# Altium footprint library 7.Connectors&Battary_holders.PcbLib: 133 footprints (part 6 of 9)
Each footprint in its own frame and in the unit in brackets; x right, y up, seen from the top. Pads: shape width x height; smd on the part's side, far side on the other; paste and mask are expansions set on the pad; w line width, h text height; cw(c..) or ccw(c..) is an arc to the next point about the centre after c.
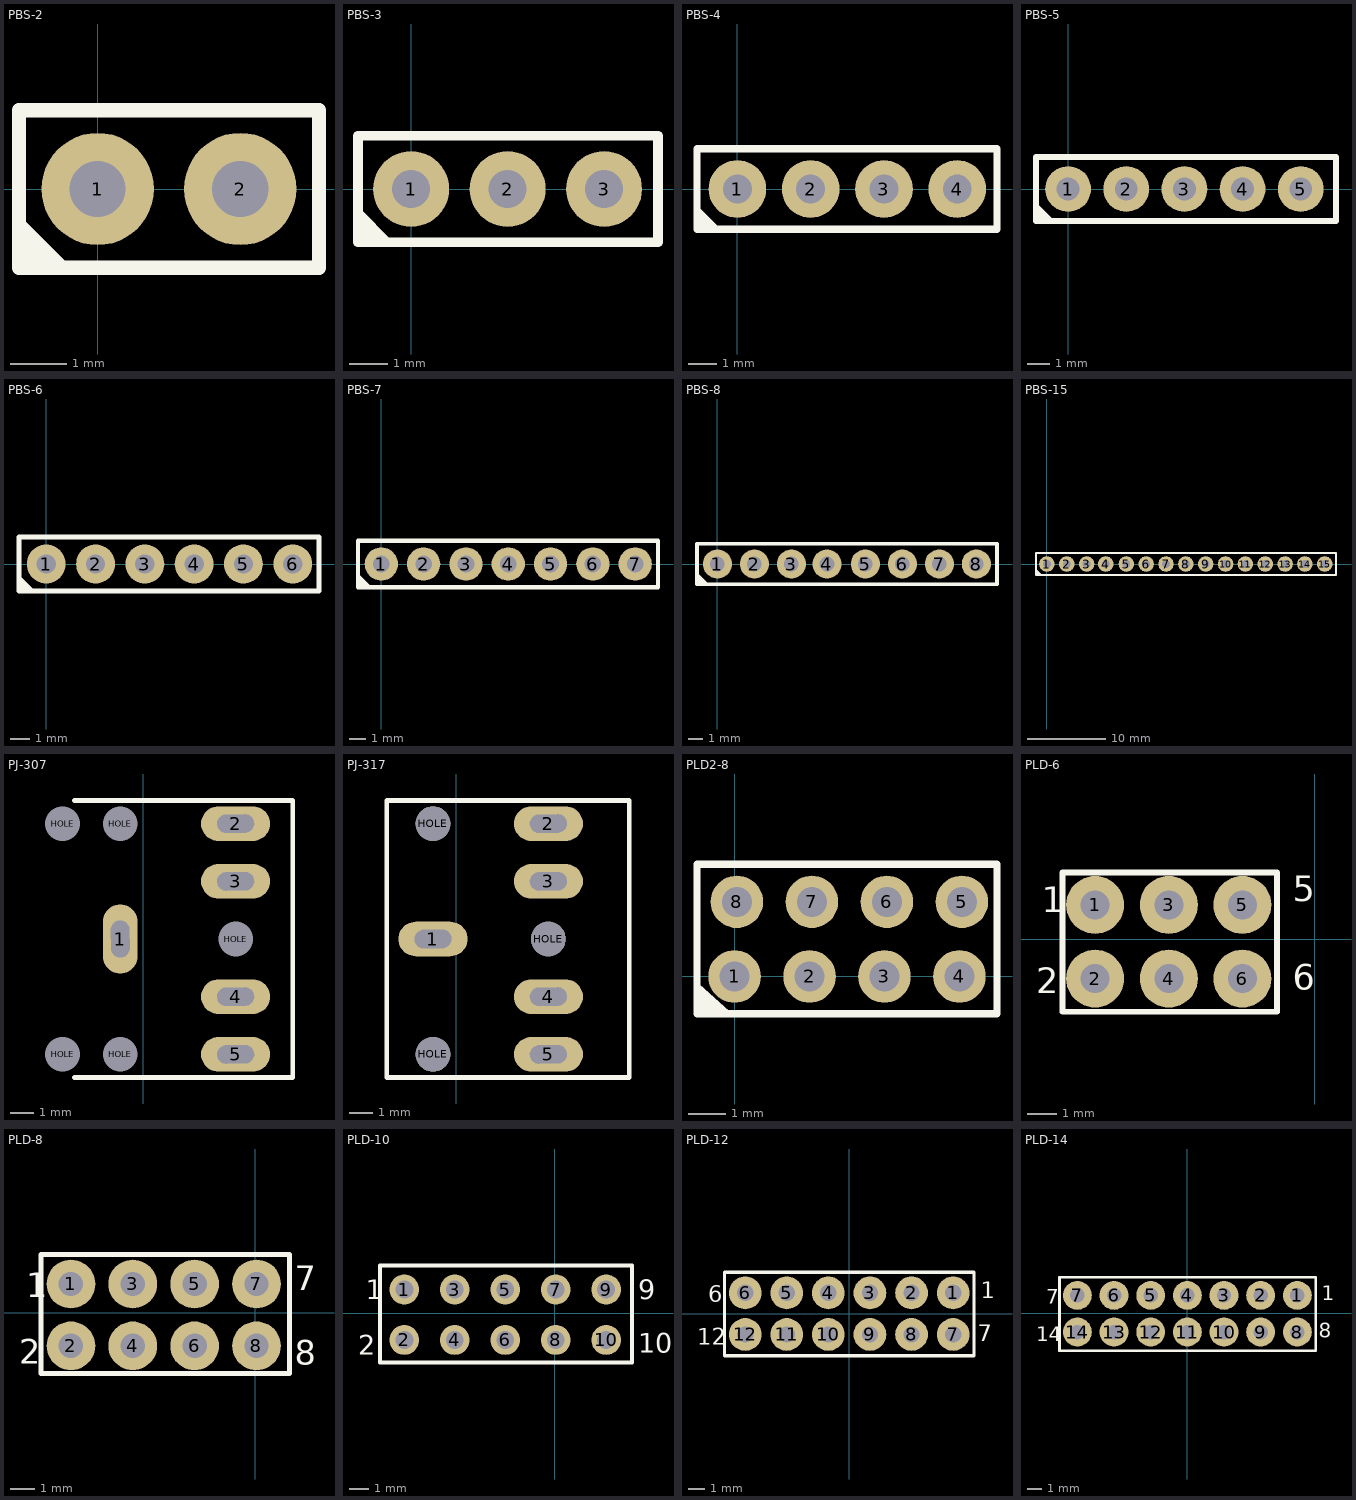
[diagram p5: the footprints below, top view; thin cyan lines are the x and y axes]

## PBS-2 [mm]
pads (2):
  round 2 hole 1: 1(0,0) 2(2.54,0)
Top Overlay:
  lines w0.2: -1.3,-1 -1.1,-1.2 -1.1,-1.4 -1.4,-1.1 -1.4,-0.8 -0.8,-1.4 -0.6,-1.4 -1.4,-0.6 ; -1.4,-0.6 -1.4,-0.6
  lines w0.254: -1.4,-1.4 -1.4,1.4 3.942,1.4 3.942,-1.4 -1.4,-1.4
3D body "User Library-DS1023.step": height 8.5, standoff -3, extent -1.27,-1.27 1.27,1.27
3D body "User Library-DS1023.step": height 8.5, standoff -3, extent 1.27,-1.27 3.81,1.27

## PBS-3 [mm]
pads (3):
  round 2 hole 1: 1(0,0) 2(2.54,0) 3(5.08,0)
Top Overlay:
  lines w0.2: -1.3,-1 -1.1,-1.2 -1.1,-1.4 -1.4,-1.1 -1.4,-0.8 -0.8,-1.4 -0.6,-1.4 -1.4,-0.6 ; -1.4,-0.6 -1.4,-0.6
  lines w0.254: -1.4,-1.4 -1.4,1.4 6.5,1.4 6.5,-1.4 -1.4,-1.4
3D body "User Library-DS1023.step": height 8.5, standoff -3, extent -1.27,-1.27 1.27,1.27
3D body "User Library-DS1023.step": height 8.5, standoff -3, extent 1.27,-1.27 3.81,1.27
3D body "User Library-DS1023.step": height 8.5, standoff -3, extent 3.81,-1.27 6.35,1.27

## PBS-4 [mm]
pads (4):
  round 2 hole 1: 1(0,0) 2(2.54,0) 3(5.08,0) 4(7.62,0)
Top Overlay:
  lines w0.2: -1.4,-0.7 -0.7,-1.4 -0.9,-1.4 -1.3,-1 -1.3,-1.3 -1.2,-1.2 -1.1,-1.2
  lines w0.254: -1.4,-1.4 -1.4,1.4 9,1.4 9,-1.4 -1.4,-1.4
3D body "User Library-DS1023.step": height 8.5, standoff -3, extent 6.35,-1.27 8.89,1.27
3D body "User Library-DS1023.step": height 8.5, standoff -3, extent 3.81,-1.27 6.35,1.27
3D body "User Library-DS1023.step": height 8.5, standoff -3, extent 1.27,-1.27 3.81,1.27
3D body "User Library-DS1023.step": height 8.5, standoff -3, extent -1.27,-1.27 1.27,1.27

## PBS-5 [mm]
pads (5):
  round 2 hole 1: 1(0,0) 2(2.54,0) 3(5.08,0) 4(7.62,0) 5(10.16,0)
Top Overlay:
  lines w0.2: -1.4,-0.7 -0.7,-1.4 -0.9,-1.4 -1.3,-1 -1.3,-1.3 -1.2,-1.2 -1.1,-1.2
  lines w0.254: -1.4,-1.4 11.7,-1.4 11.7,1.4 -1.4,1.4 -1.4,-1.4
3D body "User Library-DS1023.step": height 8.5, standoff -3, extent -1.27,-1.27 1.27,1.27
3D body "User Library-DS1023.step": height 8.5, standoff -3, extent 1.27,-1.27 3.81,1.27
3D body "User Library-DS1023.step": height 8.5, standoff -3, extent 3.81,-1.27 6.35,1.27
3D body "User Library-DS1023.step": height 8.5, standoff -3, extent 6.35,-1.27 8.89,1.27
3D body "User Library-DS1023.step": height 8.5, standoff -3, extent 8.89,-1.27 11.43,1.27

## PBS-6 [mm]
pads (6):
  round 2 hole 1: 1(0,0) 2(2.54,0) 3(5.08,0) 4(7.62,0) 5(10.16,0) 6(12.7,0)
Top Overlay:
  lines w0.2: -1.4,-0.7 -0.7,-1.4 -1,-1.4 -1.4,-1 -1.3,-1 -1,-1.3 -0.9,-1.3
  lines w0.254: -1.4,-1.4 14.049,-1.4 14.049,1.4 -1.4,1.4 -1.4,-1.4
3D body "User Library-DS1023.step": height 8.5, standoff -3, extent 11.43,-1.27 13.97,1.27
3D body "User Library-DS1023.step": height 8.5, standoff -3, extent -1.27,-1.27 1.27,1.27
3D body "User Library-DS1023.step": height 8.5, standoff -3, extent 1.27,-1.27 3.81,1.27
3D body "User Library-DS1023.step": height 8.5, standoff -3, extent 3.81,-1.27 6.35,1.27
3D body "User Library-DS1023.step": height 8.5, standoff -3, extent 6.35,-1.27 8.89,1.27
3D body "User Library-DS1023.step": height 8.5, standoff -3, extent 8.89,-1.27 11.43,1.27

## PBS-7 [mm]
pads (7):
  round 2 hole 1: 1(0,0) 2(2.54,0) 3(5.08,0) 4(7.62,0) 5(10.16,0) 6(12.7,0) 7(15.24,0)
Top Overlay:
  lines w0.2: -1.4,-0.7 -0.7,-1.4 -1,-1.4 -1.4,-1 -1.3,-1 -1,-1.3 -0.9,-1.3
  lines w0.254: -1.4,-1.4 16.609,-1.4 16.609,1.4 -1.4,1.4 -1.4,-1.4
3D body "User Library-DS1023.step": height 8.5, standoff -3, extent 11.43,-1.27 13.97,1.27
3D body "User Library-DS1023.step": height 8.5, standoff -3, extent -1.27,-1.27 1.27,1.27
3D body "User Library-DS1023.step": height 8.5, standoff -3, extent 1.27,-1.27 3.81,1.27
3D body "User Library-DS1023.step": height 8.5, standoff -3, extent 3.81,-1.27 6.35,1.27
3D body "User Library-DS1023.step": height 8.5, standoff -3, extent 6.35,-1.27 8.89,1.27
3D body "User Library-DS1023.step": height 8.5, standoff -3, extent 8.89,-1.27 11.43,1.27
3D body "User Library-DS1023.step": height 8.5, standoff -3, extent 13.97,-1.27 16.51,1.27

## PBS-8 [mm]
pads (8):
  round 2 hole 1: 1(0,0) 2(2.54,0) 3(5.08,0) 4(7.527,0) 5(10.16,0) 6(12.7,0) 7(15.24,0) 8(17.78,0)
Top Overlay:
  lines w0.2: -1.4,-0.7 -0.7,-1.4 -1,-1.4 -1.4,-1 -1.3,-1 -1,-1.3 -0.9,-1.3
  lines w0.254: -1.4,-1.4 19.2,-1.4 19.2,1.4 -1.4,1.4 -1.4,-1.4
3D body "User Library-DS1023.step": height 8.5, standoff -3, extent 16.51,-1.27 19.05,1.27
3D body "User Library-DS1023.step": height 8.5, standoff -3, extent 11.43,-1.27 13.97,1.27
3D body "User Library-DS1023.step": height 8.5, standoff -3, extent 13.97,-1.27 16.51,1.27
3D body "User Library-DS1023.step": height 8.5, standoff -3, extent -1.27,-1.27 1.27,1.27
3D body "User Library-DS1023.step": height 8.5, standoff -3, extent 1.27,-1.27 3.81,1.27
3D body "User Library-DS1023.step": height 8.5, standoff -3, extent 3.81,-1.27 6.35,1.27
3D body "User Library-DS1023.step": height 8.5, standoff -3, extent 6.35,-1.27 8.89,1.27
3D body "User Library-DS1023.step": height 8.5, standoff -3, extent 8.89,-1.27 11.43,1.27

## PBS-15 [mm]
pads (15):
  round 2 hole 1: 1(0,0) 2(2.54,0) 3(5.08,0) 4(7.527,0) 5(10.16,0) 6(12.7,0) 7(15.24,0) 8(17.78,0) 9(20.32,0) 10(22.86,0) 11(25.4,0) 12(27.94,0) 13(30.48,0) 14(33.02,0) 15(35.56,0)
Top Overlay:
  lines w0.2: -1.4,-0.7 -0.7,-1.4 -1,-1.4 -1.4,-1 -1.3,-1 -1,-1.3 -0.9,-1.3
  lines w0.254: -1.4,-1.4 -1.4,1.4 37,1.4 37,-1.4 -1.4,-1.4
3D body "User Library-PBS_(DS1023)_1line_connectors_h=5_0_8_5mm_step_2_54mm-1(1).step": height 5, standoff -3.3, extent 18.8,-1.25 37.08,1.25
3D body "User Library-PBS_(DS1023)_1line_connectors_h=5_0_8_5mm_step_2_54mm-1(2).step": height 5, standoff -3.3, extent -1.52,-1.25 19.3,1.25

## PJ-307 [mm]
pads (10):
  oval 1.5x3 hole 0.8 slot 1.6 at 90.8 deg: 1(-1,9.5)
  oval 3x1.5 hole 0.8 slot 1.6 at 0.8 deg: 2(4,14.5) 3(4,12) 4(4,7) 5(4,4.5)
  round 1.2 hole 1.5: HOLE(-3.5,4.5) HOLE(-3.5,14.5) HOLE(-1,4.5) HOLE(-1,14.5) HOLE(4,9.5)
Top Overlay:
  lines w0.2: -3,3.5 6.475,3.5 6.475,15.5 -3,15.5
3D body "pj-307.step": height 5.5, standoff -3.2, extent -7.55,3.475 6.45,15.475

## PJ-317 [mm]
pads (8):
  oval 3x1.5 hole 0.8 slot 1.6 at 0.8 deg: 1(-1,9.5) 2(4,14.5) 3(4,12) 4(4,7) 5(4,4.5)
  round 1.5 hole 1.5: HOLE(-1,4.5) HOLE(-1,14.5) HOLE(4,9.5)
Top Overlay:
  lines w0.2: -3,3.5 -3,15.5 7.5,15.5 7.5,3.5 -3,3.5
3D body "User Library-PJS_05_LB_H.step": height 10, standoff -4.13, extent -7.5,3.5 7.5,15.5

## PLD2-8 [mm]
pads (8):
  round 1.4 hole 0.8: 1(0,0) 2(2,0) 3(4,0) 4(6,0) 5(6.065,1.991) 6(4.065,1.991) 7(2.065,1.991) 8(0.065,1.991)
Top Overlay:
  circle w0.2: c0,1.5 r0.1
  lines w0.2: -0.997,-0.274 -0.2,-1 -1,-1 ; -0.777,-0.64 -0.49,-0.882 -0.799,-0.917 -0.9,-0.5 -1,-1 ; -1,-1 7,-1 7,3 -1,3 -1,-1
3D body "User Library-pls2-4_asm.STEP": height 6.1, standoff -2.7, extent -1,-1 7,1
3D body "User Library-pls2-4_asm.STEP": height 6.1, standoff -2.7, extent -1,1 7,3

## PLD-6 [mm]
pads (6):
  round 2 hole 1: 1(-7.569,1.183) 2(-7.569,-1.357) 3(-5.029,1.183) 4(-5.029,-1.357) 5(-2.489,1.183) 6(-2.489,-1.357)
Top Overlay:
  lines w0.2: -8.7,-2.5 -1.3,-2.5 -1.3,2.3 -8.7,2.3 -8.7,-2.5
  text "1" at -9.409,0.643 h1.5
  text "2" at -9.609,-2.157 h1.5
  text "5" at -0.762,1.016 h1.5
  text "6" at -0.762,-2.032 h1.5
3D body "User Library-PLD-6.step": height 8.7, standoff -2.8, extent -8.8,-2.6 -1.18,2.4

## PLD-8 [mm]
pads (8):
  round 2 hole 1: 1(-7.569,1.183) 2(-7.569,-1.357) 3(-5.029,1.183) 4(-5.029,-1.357) 5(-2.489,1.183) 6(-2.489,-1.357) 7(0.051,1.183) 8(0.051,-1.357)
Top Overlay:
  lines w0.2: -8.8,-2.5 1.4,-2.5 1.4,2.4 -8.8,2.4 -8.8,-2.5
  text "1" at -9.409,0.643 h1
  text "2" at -9.7,-2.1 h1
  text "7" at 1.618,0.916 h1
  text "8" at 1.618,-2.132 h1
3D body "User Library-PLD-8-1.step": height 8.6, standoff -2.5, extent -8.87,-2.57 1.29,2.51

## PLD-10 [mm]
pads (10):
  round 1.5 hole 0.9: 1(-7.569,1.183) 2(-7.569,-1.357) 3(-5.029,1.183) 4(-5.029,-1.357) 5(-2.489,1.183) 6(-2.489,-1.357) 7(0.051,1.183) 8(0.051,-1.357) 9(2.591,1.183) 10(2.591,-1.357)
Top Overlay:
  lines w0.2: -8.8,-2.5 -8.8,2.4 3.9,2.4 3.9,-2.5 -8.8,-2.5
  text "10" at 4.2,-2 h1
  text "9" at 4.2,0.7 h1
  text "2" at -9.9,-2.1 h1
  text "1" at -9.5,0.7 h1
3D body "User Library-PLD-10-2.step": height 8.54, standoff -3, extent -8.85,-2.6 3.85,2.48

## PLD-12 [mm]
pads (12):
  round 2 hole 1: 1(6.345,1.265) 2(3.805,1.265) 3(1.265,1.265) 4(-1.275,1.265) 5(-3.815,1.265) 6(-6.355,1.265) 7(6.345,-1.275) 8(3.805,-1.275) 9(1.265,-1.275) 10(-1.275,-1.275) 11(-3.815,-1.275) 12(-6.355,-1.275)
Top Overlay:
  lines w0.2: -7.625,-2.575 -7.625,2.525 7.625,2.525 7.625,-2.575 -7.625,-2.575
  text "7" at 7.85,-1.675 h1
  text "1" at 8.025,0.925 h1
  text "6" at -8.6,0.7 h1
  text "12" at -9.3,-1.9 h1
3D body "User Library-PR(E,P)C006DAAN-RC.STEP": height 8.42, standoff -2.95, extent -7.615,-2.565 7.625,2.515

## PLD-14 [mm]
pads (14):
  round 2 hole 1: 1(7.632,1.235) 2(5.092,1.235) 3(2.552,1.235) 4(0.012,1.235) 5(-2.528,1.235) 6(-5.068,1.235) 7(-7.608,1.235) 8(7.632,-1.305) 9(5.092,-1.305) 10(2.552,-1.305) 11(0.012,-1.305) 12(-2.528,-1.305) 13(-5.068,-1.305) 14(-7.608,-1.305)
Top Overlay:
  lines w0.2: -8.85,-2.605 8.912,-2.605 8.912,2.495 -8.85,2.495 -8.85,-2.605
  text "1" at 9.312,0.895 h1
  text "7" at -9.775,0.67 h1
  text "14" at -10.475,-1.93 h1
  text "8" at 9.112,-1.705 h1
3D body "PLD-14.STEP": height 8.42, standoff -2.96, extent -8.855,-2.605 8.925,2.475